# Altium footprint library DSO.PcbLib: 80 footprints (part 4 of 5)
Each footprint in its own frame and in the unit in brackets; x right, y up, seen from the top. Pads: shape width x height; smd on the part's side, far side on the other; paste and mask are expansions set on the pad; w line width, h text height; cw(c..) or ccw(c..) is an arc to the next point about the centre after c.
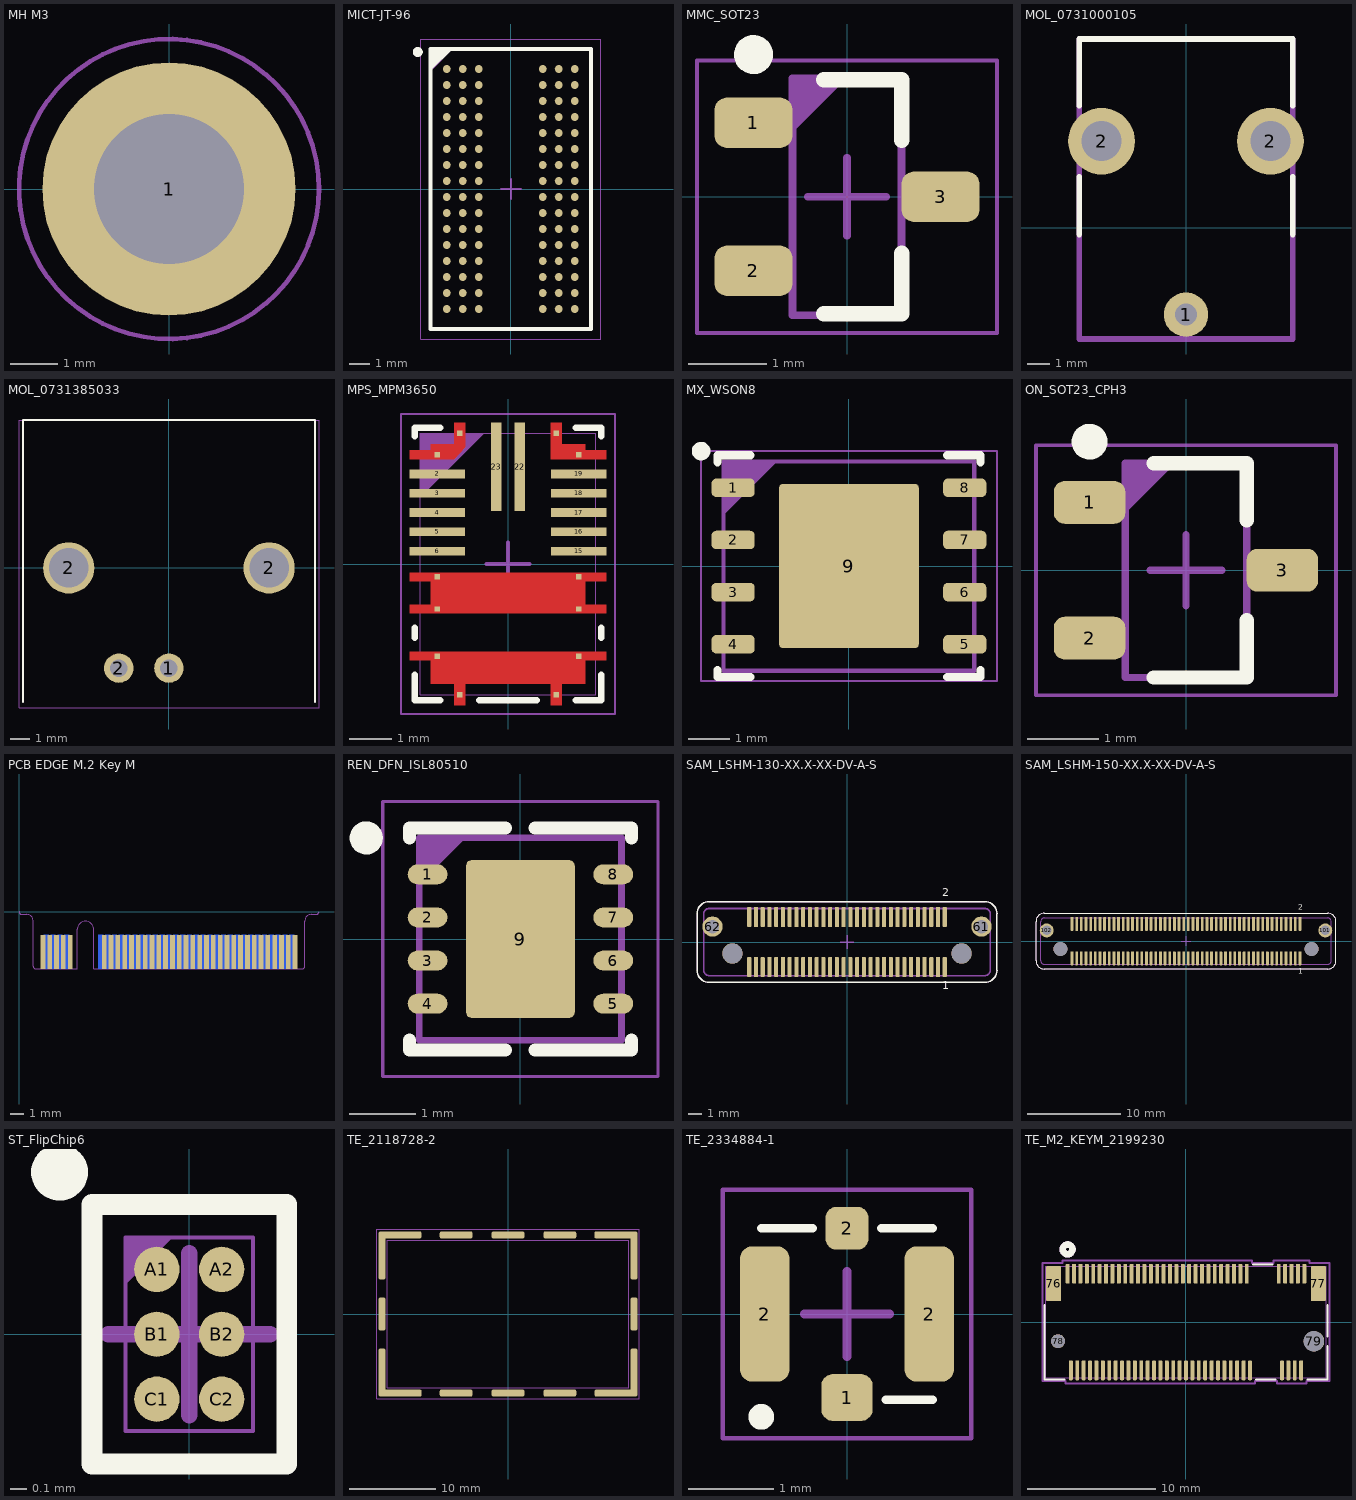
[diagram p3: the footprints below, top view; thin cyan lines are the x and y axes]

## MH M3 [mm]
pads (1):
  round 5.4 hole 3.2 unplated: 1(0,0)
Top Courtyard:
  circle w0.1: c0,0 r3.2

## MICT-JT-96 [mm] "BGA, 96-Balls, Body 14x8mm, Pitch 0.8mm"
pads (96):
  round 0.4 smd: A1(-3.2,6) A2(-2.4,6) A3(-1.6,6) A7(1.6,6) A8(2.4,6) A9(3.2,6) B1(-3.2,5.2) B2(-2.4,5.2) B3(-1.6,5.2) B7(1.6,5.2) B8(2.4,5.2) B9(3.2,5.2) C1(-3.2,4.4) C2(-2.4,4.4) C3(-1.6,4.4) C7(1.6,4.4) C8(2.4,4.4) C9(3.2,4.4) D1(-3.2,3.6) D2(-2.4,3.6) D3(-1.6,3.6) D7(1.6,3.6) D8(2.4,3.6) D9(3.2,3.6) E1(-3.2,2.8) E2(-2.4,2.8) E3(-1.6,2.8) E7(1.6,2.8) E8(2.4,2.8) E9(3.2,2.8) F1(-3.2,2) F2(-2.4,2) F3(-1.6,2) F7(1.6,2) F8(2.4,2) F9(3.2,2) G1(-3.2,1.2) G2(-2.4,1.2) G3(-1.6,1.2) G7(1.6,1.2) G8(2.4,1.2) G9(3.2,1.2) H1(-3.2,0.4) H2(-2.4,0.4) H3(-1.6,0.4) H7(1.6,0.4) H8(2.4,0.4) H9(3.2,0.4) J1(-3.2,-0.4) J2(-2.4,-0.4) J3(-1.6,-0.4) J7(1.6,-0.4) J8(2.4,-0.4) J9(3.2,-0.4) K1(-3.2,-1.2) K2(-2.4,-1.2) K3(-1.6,-1.2) K7(1.6,-1.2) K8(2.4,-1.2) K9(3.2,-1.2) L1(-3.2,-2) L2(-2.4,-2) L3(-1.6,-2) L7(1.6,-2) L8(2.4,-2) L9(3.2,-2) M1(-3.2,-2.8) M2(-2.4,-2.8) M3(-1.6,-2.8) M7(1.6,-2.8) M8(2.4,-2.8) M9(3.2,-2.8) N1(-3.2,-3.6) N2(-2.4,-3.6) N3(-1.6,-3.6) N7(1.6,-3.6) N8(2.4,-3.6) N9(3.2,-3.6) P1(-3.2,-4.4) P2(-2.4,-4.4) P3(-1.6,-4.4) P7(1.6,-4.4) P8(2.4,-4.4) P9(3.2,-4.4) R1(-3.2,-5.2) R2(-2.4,-5.2) R3(-1.6,-5.2) R7(1.6,-5.2) R8(2.4,-5.2) R9(3.2,-5.2) T1(-3.2,-6) T2(-2.4,-6) T3(-1.6,-6) T7(1.6,-6) T8(2.4,-6) T9(3.2,-6)
Top Overlay:
  circle w0.25: c-4.65,6.85 r0.125
  region: -3.049,7 -4,6.049 -4,7
  lines w0.2: -4,6.049 -3.049,7 ; -4,-7 -4,7 4,7 4,-7 -4,-7
Top Courtyard:
  lines w0.05: -4.5,-7.5 4.5,-7.5 4.5,7.5 -4.5,7.5 -4.5,-7.5
Top Assembly:
  region: -4,5.9 -2.9,7 -4,7
  lines w0.1: -4,-7 4,-7 4,7 -4,7 -4,-7
  text ".Designator" at 0.419,-4.953 h2
Top Component Center:
  lines w0.1: -0.5,0 0.5,0 ; 0,-0.5 0,0.5
3D body: height 0.25, standoff 0, extent -4,-7 4,7

## MMC_SOT23 [mm] "SOT23, 3-Leads, Body 2.92x2.37mm, Pitch 0.95mm, Height 1.12mm, IPC Medium Density"
height 1.12
pads (3):
  rrect50% 1x0.65 smd: 1(-1.2,0.95) 2(-1.2,-0.95) 3(1.2,0)
Top Overlay:
  circle w0.25: c-1.2,1.825 r0.125
  lines w0.2: -0.3,-1.5 0.7,-1.5 0.7,-0.725 ; -0.3,1.5 0.7,1.5 0.7,0.725
Top Courtyard:
  lines w0.05: -1.925,-1.75 1.925,-1.75 1.925,1.75 -1.925,1.75 -1.925,-1.75
Top Assembly:
  region: -0.7,0.82 0,1.52 -0.7,1.52
  lines w0.1: -0.7,-1.52 0.7,-1.52 0.7,1.52 -0.7,1.52 -0.7,-1.52
  text ".Designator" at 0.209,-2.477 h1
Top Component Center:
  lines w0.1: -0.5,0 0.5,0 ; 0,-0.5 0,0.5
3D body "MMC_SOT23.step": height 1.12, standoff 0, extent -1.42,-1.52 1.42,1.52

## MOL_0731000105 [mm] "Molex BNC Jack, TH Right Angle"
height 11
pads (3):
  round 2 hole 1: 1(0,-3.9)
  round 3 hole 1.8: 2(-3.8,3.9) 2(3.8,3.9)
Top Overlay:
  lines w0.254: -4.8,-0.3 -4.8,2.3 ; -4.8,5.5 -4.8,8.5 4.8,8.5 4.8,5.5 ; 4.8,-0.3 4.8,2.3
Top Courtyard:
  lines w0.254: -4.8,-5 4.8,-5 4.8,8.5 -4.8,8.5 -4.8,-5
3D body "731000105.stp": height 9.14, standoff -3.14, extent -4.825,-4.075 4.825,21.475

## MOL_0731385033 [mm]
height 15.6
pads (4):
  round 1.49 hole 0.89: 1(0,-5.08) 2(-2.54,-5.08)
  round 2.6 hole 2: 2(-5.08,0) 2(5.08,0)
Top Overlay:
  lines w0.1: -7.4,-6.8 -7.4,7.5 7.4,7.5 7.4,-6.8
Top Courtyard:
  lines w0.05: -7.6,-7.1 -7.6,7.5 7.61,7.5 7.61,-7.09 7.6,-7.1 -7.6,-7.1
3D body "731385033.stp": height 16.4, standoff -4.36, extent -7.95,-6.873 7.95,28.557

## MPS_MPM3650 [mil]
pads (24):
  rect 5x5 smd: 1(-64.96,100.39) 7(-64.96,-11.81) 8(-64.96,-41.34) 9(-64.96,-84.65) 10(-44.29,-119.92) 11(44.29,-119.92) 12(64.96,-84.65) 13(64.96,-41.34) 14(64.96,-11.81) 20(64.96,100.39) 21(44.29,119.92) 24(-44.29,119.92)
  rect 51x8 smd paste+0 mask+0: 2(-64.96,82.68) 3(-64.96,64.96) 4(-64.96,47.24) 5(-64.96,29.53) 6(-64.96,11.81) 15(64.96,11.81) 16(64.96,29.53) 17(64.96,47.24) 18(64.96,64.96) 19(64.96,82.68)
  rect 10x81 smd paste+0 mask+0: 22(10.83,89.41) 23(-10.83,89.41)
Top Layer:
  region: -90.46,96.39 -90.46,104.39 -70.78,104.39 -70.78,110.22 -49.29,109.92 -49.29,129.92 -39.29,129.92 -39.46,107.31 -49.3,96.39
  region: 39.46,96.39 39.29,129.92 49.29,129.92 49.29,109.92 70.78,110.24 70.78,104.33 90.46,104.33 90.46,96.39
  region: -90.46,-15.81 -90.46,-7.81 90.46,-7.81 90.46,-15.81 70.78,-15.81 70.78,-37.34 90.46,-37.34 90.46,-45.34 -90.46,-45.34 -90.46,-37.34 -70.78,-37.34 -70.78,-15.81
  region: -90.46,-88.65 -90.46,-80.65 90.46,-80.65 90.46,-88.65 70.78,-88.65 70.78,-109.91 49.29,-109.92 49.29,-129.92 39.29,-129.92 39.29,-109.92 -39.29,-109.92 -39.29,-129.92 -49.29,-129.92 -49.29,-109.92 -70.78,-109.91 -70.78,-88.65
Top Overlay:
  lines w6: -85.5,-101.75 -85.5,-125 -62.39,-125 ; -85.5,-67.55 -85.5,-58.44 ; -85.5,117.49 -85.5,125 -62.39,125 ; -26.19,-125 26.19,-125 ; 62.39,-125 85.5,-125 85.5,-101.75 ; 62.39,125 85.5,125 85.5,117.43 ; 85.5,-67.55 85.5,-58.44
Top Paste:
  region: -90.46,-88.65 -90.46,-80.65 90.46,-80.65 90.46,-88.65 70.78,-88.65 70.78,-109.91 49.29,-109.92 49.29,-129.92 39.29,-129.92 39.29,-109.92 -39.29,-109.92 -39.29,-129.92 -49.29,-129.92 -49.29,-109.92 -70.78,-109.91 -70.78,-88.65
  region: -90.46,-15.81 -90.46,-7.81 90.46,-7.81 90.46,-15.81 70.78,-15.81 70.78,-37.34 90.46,-37.34 90.46,-45.34 -90.46,-45.34 -90.46,-37.34 -70.78,-37.34 -70.78,-15.81
  region: 39.46,96.39 39.29,129.92 49.29,129.92 49.29,109.92 70.78,110.24 70.78,104.33 90.46,104.33 90.46,96.39
  region: -90.46,96.39 -90.46,104.39 -70.78,104.39 -70.78,110.22 -49.29,109.92 -49.29,129.92 -39.29,129.92 -39.46,107.31 -49.3,96.39
Top Solder:
  region: -90.46,-88.65 -90.46,-80.65 90.46,-80.65 90.46,-88.65 70.78,-88.65 70.78,-109.91 49.29,-109.92 49.29,-129.92 39.29,-129.92 39.29,-109.92 -39.29,-109.92 -39.29,-129.92 -49.29,-129.92 -49.29,-109.92 -70.78,-109.91 -70.78,-88.65
  region: -90.46,-15.81 -90.46,-7.81 90.46,-7.81 90.46,-15.81 70.78,-15.81 70.78,-37.34 90.46,-37.34 90.46,-45.34 -90.46,-45.34 -90.46,-37.34 -70.78,-37.34 -70.78,-15.81
  region: 39.46,96.39 39.29,129.92 49.29,129.92 49.29,109.92 70.78,110.24 70.78,104.33 90.46,104.33 90.46,96.39
  region: -90.46,96.39 -90.46,104.39 -70.78,104.39 -70.78,110.22 -49.29,109.92 -49.29,129.92 -39.29,129.92 -39.46,107.31 -49.3,96.39
Top Courtyard:
  lines w1.97: -98.43,-137.8 98.43,-137.8 98.43,137.8 -98.43,137.8 -98.43,-137.8
Mechanical 7:
Top Assembly:
  region: -80.5,61.23 -21.73,120 -80.5,120
  lines w1: -80.5,-120 -80.5,120 80.5,120 80.5,-120 -80.5,-120
  text ".Designator" at 8.24,-97.5 h39.37
Top Component Center:
  lines w3.94: -19.69,0 19.68,0 ; 0,-19.68 0,19.68
3D body "MPM3650 (QFN-24).step": height 62.99, standoff -0.98, extent -79.13,-118.5 79.13,118.5

## MX_WSON8 [mm] "SON, 8-Leads, Body 5.00x6.00mm, Pitch 1.27mm, Thermal Pad 4.00x3.40mm, IPC Medium Density"
height 0.8
pads (9):
  rrect50% 1.05x0.45 smd: 1(-2.82,1.905) 2(-2.82,0.635) 3(-2.82,-0.635) 4(-2.82,-1.905) 5(2.82,-1.905) 6(2.82,-0.635) 7(2.82,0.635) 8(2.82,1.905)
  rrect5% 3.4x4 smd paste-1.7: 9(0,0)
Top Overlay:
  circle w0.25: c-3.6,2.8 r0.1
  lines w0.2: -3.2,-2.53 -3.2,-2.7 -2.395,-2.7 ; -3.2,2.53 -3.2,2.7 -2.395,2.7 ; 2.395,-2.7 3.2,-2.7 3.2,-2.53 ; 2.395,2.7 3.2,2.7 3.2,2.53
Top Paste:
  rectangle: -1.6,0.1 -0.1,1.9
  rectangle: -1.6,-1.9 -0.1,-0.1
  rectangle: 0.1,0.1 1.6,1.9
  rectangle: 0.1,-1.9 1.6,-0.1
Top Courtyard:
  lines w0.05: -3.605,-2.8 -3.605,2.8 3.605,2.8 3.605,-2.8 -3.605,-2.8
Top Assembly:
  region: -3.05,1.25 -1.75,2.55 -3.05,2.55
  lines w0.1: -3.05,-2.55 3.05,-2.55 3.05,2.55 -3.05,2.55 -3.05,-2.55
  text ".Designator" at 0.209,-2.477 h1
Top Component Center:
  lines w0.1: -0.5,0 0.5,0 ; 0,-0.5 0,0.5
3D body "MX_WSON8.step": height 0.8, standoff 0, extent -3.051,-2.55 3.051,2.55

## ON_SOT23_CPH3 [mm] "SOT23, 3-Leads, Body 2.90x2.80mm, Pitch 0.95mm, Height 0.95mm, IPC Medium Density"
height 0.95
pads (3):
  rrect50% 1x0.6 smd: 1(-1.35,0.95) 2(-1.35,-0.95) 3(1.35,0)
Top Overlay:
  circle w0.25: c-1.35,1.8 r0.125
  lines w0.2: -0.45,-1.5 0.85,-1.5 0.85,-0.7 ; -0.45,1.5 0.85,1.5 0.85,0.7
Top Courtyard:
  lines w0.05: -2.1,-1.75 2.1,-1.75 2.1,1.75 -2.1,1.75 -2.1,-1.75
Top Assembly:
  region: -0.85,0.8 -0.15,1.5 -0.85,1.5
  lines w0.1: -0.85,-1.5 0.85,-1.5 0.85,1.5 -0.85,1.5 -0.85,-1.5
  text ".Designator" at 0.209,-2.477 h1
Top Component Center:
  lines w0.1: -0.5,0 0.5,0 ; 0,-0.5 0,0.5
3D body "ON_SOT23_CPH3.step": height 0.95, standoff 0, extent -1.575,-1.5 1.575,1.5

## PCB EDGE M.2 Key M [mm]
pads (67):
  rect 0.35x2.5 smd mask+0.102: 1(20.25,-2.95) 3(19.75,-2.95) 5(19.25,-2.95) 7(18.75,-2.95) 9(18.25,-2.95) 11(17.75,-2.95) 13(17.25,-2.95) 15(16.75,-2.95) 17(16.25,-2.95) 19(15.75,-2.95) 21(15.25,-2.95) 23(14.75,-2.95) 25(14.25,-2.95) 27(13.75,-2.95) 29(13.25,-2.95) 31(12.75,-2.95) 33(12.25,-2.95) 35(11.75,-2.95) 37(11.25,-2.95) 39(10.75,-2.95) 41(10.25,-2.95) 43(9.75,-2.95) 45(9.25,-2.95) 47(8.75,-2.95) 49(8.25,-2.95) 51(7.75,-2.95) 53(7.25,-2.95) 55(6.75,-2.95) 57(6.25,-2.95) 67(3.75,-2.95) 69(3.25,-2.95) 71(2.75,-2.95) 73(2.25,-2.95) 75(1.75,-2.95)
  rect 0.35x2.5 smd far side mask+0.102: 2(20,-2.95) 4(19.5,-2.95) 6(19,-2.95) 8(18.5,-2.95) 10(18,-2.95) 12(17.5,-2.95) 14(17,-2.95) 16(16.5,-2.95) 18(16,-2.95) 20(15.5,-2.95) 22(15,-2.95) 24(14.5,-2.95) 26(14,-2.95) 28(13.5,-2.95) 30(13,-2.95) 32(12.5,-2.95) 34(12,-2.95) 36(11.5,-2.95) 38(11,-2.95) 40(10.5,-2.95) 42(10,-2.95) 44(9.5,-2.95) 46(9,-2.95) 48(8.5,-2.95) 50(8,-2.95) 52(7.5,-2.95) 54(7,-2.95) 56(6.5,-2.95) 58(6,-2.95) 68(3.5,-2.95) 70(3,-2.95) 72(2.5,-2.95) 74(2,-2.95)
Mechanical 1:
  lines w0.05: 0,0 ccw(c0.2,0) 0.2,-0.2 0.55,-0.2 cw(c0.55,-0.7) 1.05,-0.7 1.05,-4 ccw(c1.25,-4) 1.25,-4.2 4.275,-4.2 4.275,-1.3 cw(c4.875,-1.3) 4.875,-0.7 cw(c4.875,-1.3) 5.475,-1.3 5.475,-4.2 16,-4.2 20.75,-4.2 ccw(c20.75,-4) 20.95,-4 20.95,-0.7 cw(c21.45,-0.7) 21.45,-0.2 21.8,-0.2 ccw(c21.8,0) 22,0

## REN_DFN_ISL80510 [mm] "QFN, 8-Leads, Body 3.00x3.00mm, Pitch 0.65mm, Thermal Pad 1.62x2.36mm, IPC Medium Density"
height 1
pads (9):
  oval 0.6x0.3 smd: 1(-1.4,0.975) 2(-1.4,0.325) 3(-1.4,-0.325) 4(-1.4,-0.975) 5(1.4,-0.975) 6(1.4,-0.325) 7(1.4,0.325) 8(1.4,0.975)
  rrect10% 1.64x2.38 smd paste-0.1: 9(0,0)
Top Overlay:
  circle w0.25: c-2.325,1.525 r0.125
  lines w0.2: -1.675,-1.525 -1.675,-1.675 -0.225,-1.675 ; -1.675,1.525 -1.675,1.675 -0.225,1.675 ; 0.225,-1.675 1.675,-1.675 1.675,-1.525 ; 0.225,1.675 1.675,1.675 1.675,1.525
Top Courtyard:
  lines w0.05: -2.075,-2.075 2.075,-2.075 2.075,2.075 -2.075,2.075 -2.075,-2.075
Top Assembly:
  region: -1.525,0.825 -0.825,1.525 -1.525,1.525
  lines w0.1: -1.525,-1.525 -1.525,1.525 1.525,1.525 1.525,-1.525 -1.525,-1.525
  text ".Designator" at 0.209,-2.477 h1
Top Component Center:
  lines w0.1: -0.5,0 0.5,0 ; 0,-0.5 0,0.5
3D body "REN_DFN_ISL80510.step": height 1, standoff 0, extent -1.526,-1.525 1.526,1.525

## SAM_LSHM-130-XX.X-XX-DV-A-S [mm]
pads (64):
  rrect50% 0.3x1.5 smd: 1(7.25,-1.85) 2(7.25,1.85) 3(6.75,-1.85) 4(6.75,1.85) 5(6.25,-1.85) 6(6.25,1.85) 7(5.75,-1.85) 8(5.75,1.85) 9(5.25,-1.85) 10(5.25,1.85) 11(4.75,-1.85) 12(4.75,1.85) 13(4.25,-1.85) 14(4.25,1.85) 15(3.75,-1.85) 16(3.75,1.85) 17(3.25,-1.85) 18(3.25,1.85) 19(2.75,-1.85) 20(2.75,1.85) 21(2.25,-1.85) 22(2.25,1.85) 23(1.75,-1.85) 24(1.75,1.85) 25(1.25,-1.85) 26(1.25,1.85) 27(0.75,-1.85) 28(0.75,1.85) 29(0.25,-1.85) 30(0.25,1.85) 31(-0.25,-1.85) 32(-0.25,1.85) 33(-0.75,-1.85) 34(-0.75,1.85) 35(-1.25,-1.85) 36(-1.25,1.85) 37(-1.75,-1.85) 38(-1.75,1.85) 39(-2.25,-1.85) 40(-2.25,1.85) 41(-2.75,-1.85) 42(-2.75,1.85) 43(-3.25,-1.85) 44(-3.25,1.85) 45(-3.75,-1.85) 46(-3.75,1.85) 47(-4.25,-1.85) 48(-4.25,1.85) 49(-4.75,-1.85) 50(-4.75,1.85) 51(-5.25,-1.85) 52(-5.25,1.85) 53(-5.75,-1.85) 54(-5.75,1.85) 55(-6.25,-1.85) 56(-6.25,1.85) 57(-6.75,-1.85) 58(-6.75,1.85) 59(-7.25,-1.85) 60(-7.25,1.85)
  round 1.5 hole 1: 61(9.975,1.15) 62(-9.975,1.15)
  round 1.5 hole 1.5 unplated: ""(-8.5,-0.85) ""(8.5,-0.85)
Top Overlay:
  lines w0.1: -11.125,-2.1 ccw(c-10.225,-2.1) -10.225,-3 10.225,-3 ccw(c10.225,-2.1) 11.125,-2.1 11.125,2.1 ccw(c10.225,2.1) 10.225,3 -10.225,3 ccw(c-10.225,2.1) -11.125,2.1 -11.125,-2.1
  text "1" at 7.061,-3.725 h1
  text "2" at 7.064,3.175 h1
Top Courtyard:
  lines w0.05: -11.125,-2.1 ccw(c-10.225,-2.1) -10.225,-3 10.225,-3 ccw(c10.225,-2.1) 11.125,-2.1 11.125,2.1 ccw(c10.225,2.1) 10.225,3 -10.225,3 ccw(c-10.225,2.1) -11.125,2.1 -11.125,-2.1
Top Assembly:
  lines w0.127: -10.625,-2.09 ccw(c-10.225,-2.09) -10.225,-2.49 10.225,-2.49 ccw(c10.225,-2.09) 10.625,-2.09 10.625,2.09 ccw(c10.225,2.09) 10.225,2.49 -10.225,2.49 ccw(c-10.225,2.09) -10.625,2.09 -10.625,-2.09
  text "2" at 7.064,3.175 h1
  text "1" at 7.061,-3.725 h1
  text ".Designator" at -4.953,-0.419 h2
Top Component Center:
  lines w0.1: -0.5,0 0.5,0 ; 0,-0.5 0,0.5
3D body "LSHM-130-04.0-L-DV-A-S-K-TR.stp": height 5.6, standoff -1.65, extent -10.401,-2.49 10.401,2.64

## SAM_LSHM-150-XX.X-XX-DV-A-S [mm]
pads (104):
  rrect50% 0.3x1.5 smd: 1(12.25,-1.85) 2(12.25,1.85) 3(11.75,-1.85) 4(11.75,1.85) 5(11.25,-1.85) 6(11.25,1.85) 7(10.75,-1.85) 8(10.75,1.85) 9(10.25,-1.85) 10(10.25,1.85) 11(9.75,-1.85) 12(9.75,1.85) 13(9.25,-1.85) 14(9.25,1.85) 15(8.75,-1.85) 16(8.75,1.85) 17(8.25,-1.85) 18(8.25,1.85) 19(7.75,-1.85) 20(7.75,1.85) 21(7.25,-1.85) 22(7.25,1.85) 23(6.75,-1.85) 24(6.75,1.85) 25(6.25,-1.85) 26(6.25,1.85) 27(5.75,-1.85) 28(5.75,1.85) 29(5.25,-1.85) 30(5.25,1.85) 31(4.75,-1.85) 32(4.75,1.85) 33(4.25,-1.85) 34(4.25,1.85) 35(3.75,-1.85) 36(3.75,1.85) 37(3.25,-1.85) 38(3.25,1.85) 39(2.75,-1.85) 40(2.75,1.85) 41(2.25,-1.85) 42(2.25,1.85) 43(1.75,-1.85) 44(1.75,1.85) 45(1.25,-1.85) 46(1.25,1.85) 47(0.75,-1.85) 48(0.75,1.85) 49(0.25,-1.85) 50(0.25,1.85) 51(-0.25,-1.85) 52(-0.25,1.85) 53(-0.75,-1.85) 54(-0.75,1.85) 55(-1.25,-1.85) 56(-1.25,1.85) 57(-1.75,-1.85) 58(-1.75,1.85) 59(-2.25,-1.85) 60(-2.25,1.85) 61(-2.75,-1.85) 62(-2.75,1.85) 63(-3.25,-1.85) 64(-3.25,1.85) 65(-3.75,-1.85) 66(-3.75,1.85) 67(-4.25,-1.85) 68(-4.25,1.85) 69(-4.75,-1.85) 70(-4.75,1.85) 71(-5.25,-1.85) 72(-5.25,1.85) 73(-5.75,-1.85) 74(-5.75,1.85) 75(-6.25,-1.85) 76(-6.25,1.85) 77(-6.75,-1.85) 78(-6.75,1.85) 79(-7.25,-1.85) 80(-7.25,1.85) 81(-7.75,-1.85) 82(-7.75,1.85) 83(-8.25,-1.85) 84(-8.25,1.85) 85(-8.75,-1.85) 86(-8.75,1.85) 87(-9.25,-1.85) 88(-9.25,1.85) 89(-9.75,-1.85) 90(-9.75,1.85) 91(-10.25,-1.85) 92(-10.25,1.85) 93(-10.75,-1.85) 94(-10.75,1.85) 95(-11.25,-1.85) 96(-11.25,1.85) 97(-11.75,-1.85) 98(-11.75,1.85) 99(-12.25,-1.85) 100(-12.25,1.85)
  round 1.5 hole 1: 101(14.975,1.15) 102(-14.975,1.15)
  round 1.5 hole 1.5 unplated: ""(-13.5,-0.85) ""(13.5,-0.85)
Top Overlay:
  lines w0.1: -16.125,-2.1 ccw(c-15.225,-2.1) -15.225,-3 15.225,-3 ccw(c15.225,-2.1) 16.125,-2.1 16.125,2.1 ccw(c15.225,2.1) 15.225,3 -15.225,3 ccw(c-15.225,2.1) -16.125,2.1 -16.125,-2.1
  text "2" at 12.064,3.175 h1
  text "1" at 12.061,-3.725 h1
Top Courtyard:
  lines w0.05: -16.125,-2.1 ccw(c-15.225,-2.1) -15.225,-3 15.225,-3 ccw(c15.225,-2.1) 16.125,-2.1 16.125,2.1 ccw(c15.225,2.1) 15.225,3 -15.225,3 ccw(c-15.225,2.1) -16.125,2.1 -16.125,-2.1
Top Assembly:
  lines w0.127: -15.625,-2.09 ccw(c-15.225,-2.09) -15.225,-2.49 15.225,-2.49 ccw(c15.225,-2.09) 15.625,-2.09 15.625,2.09 ccw(c15.225,2.09) 15.225,2.49 -15.225,2.49 ccw(c-15.225,2.09) -15.625,2.09 -15.625,-2.09
  text ".Designator" at -4.953,-0.419 h2
  text "2" at 12.064,3.175 h1
  text "1" at 12.061,-3.725 h1
Top Component Center:
  lines w0.1: -0.5,0 0.5,0 ; 0,-0.5 0,0.5
3D body "LSHM-150-04.0-L-DV-A-S-K-TR.stp": height 5.6, standoff -1.65, extent -15.401,-2.49 15.401,2.64

## ST_FlipChip6 [mil] "BGA, 6-Leads, Body 0.78x1.18mmx0.36mm, Pitch 0.40mm"
height 14.57
pads (6):
  round 11 smd paste+0 mask+0: A1(-7.88,15.75) A2(7.88,15.75) B1(-7.88,0) B2(7.88,0) C1(-7.88,-15.75) C2(7.88,-15.75)
Top Overlay:
  circle w9.84: c-31.5,39.37 r1.97
  lines w5: -23.62,-31.5 23.62,-31.5 23.62,31.5 -23.62,31.5 -23.62,-31.5
Top Courtyard:
  lines w1.97: -23.62,-31.5 23.62,-31.5 23.62,31.5 -23.62,31.5 -23.62,-31.5
Top Assembly:
  region: -15.5,12.06 -4.06,23.5 -15.5,23.5
  lines w1: -15.5,-23.5 -15.5,23.5 15.5,23.5 15.5,-23.5 -15.5,-23.5
  text ".Designator" at 6.59,-77.86 h31.5
Top Component Center:
  lines w3.94: -19.68,0 19.69,0 ; 0,-19.69 0,19.68
3D body "BGA_00J105R_STM.step": height 14.09, standoff 0.01, extent -15.51,-23.5 15.51,23.5

## TE_2118728-2 [mm]
height 7
pads (16):
  rrect50% 0.8x5.55 smd: 1(-14.581,6.772) 1(-14.579,-6.772) 1(14.579,6.772) 1(14.581,-6.772)
  rrect50% 0.8x3.8 smd: 1(-14.579,0.003) 1(14.581,0.003)
  rrect50% 4.98x0.8 smd: 1(-12.491,9.147) 1(-12.489,-9.147) 1(12.489,9.147) 1(12.491,-9.147)
  rrect50% 3.8x0.8 smd: 1(-6.001,9.147) 1(-5.999,-9.147) 1(-0.001,9.147) 1(0.001,-9.147) 1(5.999,9.147) 1(6.001,-9.147)
Top Courtyard:
  lines w0.05: -15.2,-9.8 -15.2,9.8 15.2,9.8 15.2,-9.8 -15.2,-9.8 ; -13.975,-8.55 -13.975,8.55 13.975,8.55 13.975,-8.55 -13.975,-8.55
3D body "c-2118728-2-a-3d.stp": height 7, standoff 0, extent -14.68,-9.25 14.68,9.25

## TE_2334884-1 [mm]
height 0.6
pads (4):
  rrect50% 0.6x0.55 smd: 1(0,-0.975)
  rrect50% 0.58x1.58 smd: 2(-0.96,0) 2(0.96,0)
  rrect50% 0.5x0.5 smd: 2(0,1)
Top Overlay:
  circle w0.2: c-1,-1.2 r0.05
  lines w0.1: -1,1 -0.4,1 ; 0.4,1 1,1 ; 0.45,-1 1,-1
Top Courtyard:
  lines w0.05: -1.45,-1.45 1.45,-1.45 1.45,1.45 -1.45,1.45 -1.45,-1.45
Top Component Center:
  lines w0.1: -0.5,0 0.5,0 ; 0,-0.5 0,0.5
3D body "c-2334884-1-a2-3d.stp": height 0.6, standoff 0, extent -1,-1 1,1

## TE_M2_KEYM_2199230 [mil]
pads (71):
  rrect50% 12x61 smd paste+0 mask+0: 1(-364.17,148.62) 2(-354.33,-148.62) 3(-344.49,148.62) 4(-334.65,-148.62) 5(-324.8,148.62) 6(-314.96,-148.62) 7(-305.12,148.62) 8(-295.28,-148.62) 9(-285.43,148.62) 10(-275.59,-148.62) 11(-265.75,148.62) 12(-255.91,-148.62) 13(-246.06,148.62) 14(-236.22,-148.62) 15(-226.38,148.62) 16(-216.54,-148.62) 17(-206.69,148.62) 18(-196.85,-148.62) 19(-187.01,148.62) 20(-177.17,-148.62) 21(-167.32,148.62) 22(-157.48,-148.62) 23(-147.64,148.62) 24(-137.8,-148.62) 25(-127.95,148.62) 26(-118.11,-148.62) 27(-108.27,148.62) 28(-98.43,-148.62) 29(-88.58,148.62) 30(-78.74,-148.62) 31(-68.9,148.62) 32(-59.06,-148.62) 33(-49.21,148.62) 34(-39.37,-148.62) 35(-29.53,148.62) 36(-19.68,-148.62) 37(-9.84,148.62) 38(0,-148.62) 39(9.84,148.62) 40(19.69,-148.62) 41(29.53,148.62) 42(39.37,-148.62) 43(49.21,148.62) 44(59.06,-148.62) 45(68.9,148.62) 46(78.74,-148.62) 47(88.58,148.62) 48(98.43,-148.62) 49(108.27,148.62) 50(118.11,-148.62) 51(127.95,148.62) 52(137.8,-148.62) 53(147.64,148.62) 54(157.48,-148.62) 55(167.32,148.62) 56(177.17,-148.62) 57(187.01,148.62) 58(196.85,-148.62) 67(285.43,148.62) 68(295.28,-148.62) 69(305.12,148.62) 70(314.96,-148.62) 71(324.8,148.62) 72(334.65,-148.62) 73(344.49,148.62) 74(354.33,-148.62) 75(364.17,148.62)
  rrect20% 47x108 smd: 76(-407.48,118.11) 77(407.48,118.11)
  round 43 hole 43 unplated: 78(-393.7,-59.06)
  round 63 hole 63 unplated: 79(393.7,-59.06)
Top Overlay:
  circle w20: c-364.17,223.62 r15
  lines w6: -436,52.01 -436,-176.5 -373.43,-176.5 ; 206.11,176.5 266.33,176.5 ; 215.95,-176.5 276.18,-176.5 ; 373.43,-176.5 436,-176.5 436,-73.2 ; 436,-44.92 436,52.01
Bottom Overlay:
  circle w20: c-364.17,223.62 r15
Top Assembly:
  circle w20: c-364.17,223.62 r15
  lines w1: -431,-171.5 -431,171.5 431,171.5 431,-171.5 -431,-171.5
  lines w6: -441,54.11 -441,-181.5 -370.33,-181.5 -370.33,-189.12 212.85,-189.12 212.85,-181.5 279.28,-181.5 279.28,-189.12 370.33,-189.12 370.33,-181.5 441,-181.5 441,54.11 ; -441,54.11 -440.98,54.11 ; -440.98,54.11 -440.98,182.11 -380.17,182.11 -380.17,189.12 203.01,189.12 203.01,181.5 269.43,181.5 269.43,189.12 380.17,189.12 380.17,182.11 440.98,182.11 440.98,54.11 ; 440.98,54.11 441,54.11
  text ".Designator" at -195,-16.49 h78.74
3D body "c-1-2199230-5-b3-3d.stp": height 161.22, standoff -23.82, extent -431.1,-171.26 431.1,171.26
3D body: height 10, standoff 0, extent 364.17,-148.62 374.17,-138.62